# Altium footprint library Connectors THD.PcbLib: 631 footprints (part 22 of 46) (continued)
## HFBR-x41xTZ [mm] "HFBR-14xxZ, HFBR-14xxZ Series With Threaded ST Port, Fiber Optic Transmitter or Receiver, Through Hole Mount" (continued)
3D body: height 10.2, standoff -3.6, extent -5.08,-6.35 22.12,6.35

## HFBR-x52x [mm] "HFBR-0500Z Series, Fiber Optic Transmitter or Receiver, Through Hole Mount"
height 7.62
pads (6):
  round 1.7 hole 1: 1(-3.81,3.81) 2(-3.81,1.27) 3(-3.81,-1.27) 4(-3.81,-3.81) 5(3.81,3.81) 8(3.81,-3.81)
Top Overlay:
  circle w0.2: c11.62,-2.6 r0.6
  circle w0.2: c11.62,2.6 r0.6
  circle w0.3: c-6.65,3.2 r0.15
  lines w0.2: -6.58,-5.08 1.12,-5.08 1.12,-3.05 2.72,-3.05 2.72,-4.25 1.92,-4.065 1.92,-5.08 5.72,-5.08 11.067,-2.833 cw(c11.62,-2.6) 11.311,-2.086 7.554,-3.129 cw(c7.42,-2.647) 6.923,-2.7 6.923,2.7 cw(c7.42,2.647) 7.554,3.129 11.311,2.086 cw(c11.62,2.6) 11.067,2.833 5.72,5.08 1.92,5.08 1.92,6.095 2.72,5.91 2.72,7.11 1.12,7.11 1.12,5.08 -6.58,5.08 -6.58,3.88 -5.98,3.88 -5.98,0.6 -6.58,0.6 -6.58,-0.6 -5.98,-0.6 -5.98,-3.88 -6.58,-3.88 -6.58,-5.08
Mechanical 8:
  lines w0.1: -4.31,-3.81 -3.81,-3.81 ; -4.31,-1.27 -3.81,-1.27 ; -4.31,1.27 -3.81,1.27 ; -4.31,3.81 -3.81,3.81 ; -3.81,-4.31 -3.81,-3.81 ; -3.81,-3.31 -3.81,-3.81 ; -3.81,-1.77 -3.81,-1.27 ; -3.81,-0.77 -3.81,-1.27 ; -3.81,0.77 -3.81,1.27 ; -3.81,1.77 -3.81,1.27 ; -3.81,3.31 -3.81,3.81 ; -3.81,4.31 -3.81,3.81 ; -3.31,-3.81 -3.81,-3.81 ; -3.31,-1.27 -3.81,-1.27 ; -3.31,1.27 -3.81,1.27 ; -3.31,3.81 -3.81,3.81 ; -0.5,0 0,0 ; 0,-0.5 0,0 ; 0,0.5 0,0 ; 0.5,0 0,0 ; 3.31,-3.81 3.81,-3.81 ; 3.31,3.81 3.81,3.81 ; 3.81,-4.31 3.81,-3.81 ; 3.81,-3.31 3.81,-3.81 ; 3.81,3.31 3.81,3.81 ; 3.81,4.31 3.81,3.81 ; 4.31,-3.81 3.81,-3.81 ; 4.31,3.81 3.81,3.81
Mechanical 14:
  circle w0.1: c11.62,2.6 r0.6
  circle w0.1: c11.62,-2.6 r0.6
  circle w0.3: c-6.65,3.2 r0.15
  lines w0.1: -6.58,-5.08 -6.58,-3.88 -5.98,-3.88 -5.98,-0.6 -6.58,-0.6 -6.58,0.6 -5.98,0.6 -5.98,3.88 -6.58,3.88 -6.58,5.08 1.12,5.08 1.12,7.11 2.72,7.11 2.72,5.91 1.92,6.095 1.92,5.08 5.72,5.08 11.067,2.833 ccw(c11.62,2.6) 11.311,2.086 7.554,3.129 ccw(c7.42,2.647) 6.923,2.7 6.923,-2.7 ccw(c7.42,-2.647) 7.554,-3.129 11.311,-2.086 ccw(c11.62,-2.6) 11.067,-2.833 5.72,-5.08 1.92,-5.08 1.92,-4.065 2.72,-4.25 2.72,-3.05 1.12,-3.05 1.12,-5.08 -6.58,-5.08 ; 3.11,-3.81 ccw(c3.81,-3.81) 4.51,-3.81 4.51,3.81 ccw(c3.81,3.81) 3.11,3.81 3.11,-3.81
3D body: height 7.66, standoff -4, extent -6.58,-5.08 12.22,7.11

## HFBR-x53x [mm] "HFBR-0500Z Series, Vertical Package Fiber Optic Transmitter or Receiver, Through Hole Mount"
height 18.8
pads (7):
  round 1.7 hole 1: 1(-3.81,3.81) 2(-3.81,1.27) 3(-3.81,-1.27) 4(-3.81,-3.81) 5(3.81,-3.81) 8(3.81,3.81)
  round 4.6 hole 2.3: MTG1(0,0)
Top Overlay:
  circle w0.2: c-8.24,0 r1.9
  lines w0.2: -11.73,-3.88 -12.75,-3.88 -12.75,-5.08 -11.73,-5.08 ; -11.73,-3.2 -4.901,-3.2 ; -11.73,-2 -4.825,-2 ; -11.73,2 -4.825,2 ; -11.73,3.2 -4.901,3.2 ; -11.73,3.88 -12.75,3.88 -12.75,5.08 5.54,5.08 5.54,-5.08 -11.73,-5.08 ; -4.75,-5.08 -4.75,-4.634 ; -4.75,-0.446 -4.75,0.446 ; -4.75,4.634 -4.75,7.11 -11.73,7.11 -11.73,-5.08 ; -3.276,-2.4 -1.27,-2.4 ; -3.276,2.4 -1.27,2.4 ; 1.484,-2.4 3.49,-2.4 ; 1.484,2.4 3.49,2.4 ; 3.49,-2.602 3.49,2.602 ; 4.13,-2.602 4.13,2.602
Mechanical 8:
  lines w0.1: -4.31,-3.81 -3.81,-3.81 ; -4.31,-1.27 -3.81,-1.27 ; -4.31,1.27 -3.81,1.27 ; -4.31,3.81 -3.81,3.81 ; -3.81,-4.31 -3.81,-3.81 ; -3.81,-3.31 -3.81,-3.81 ; -3.81,-1.77 -3.81,-1.27 ; -3.81,-0.77 -3.81,-1.27 ; -3.81,0.77 -3.81,1.27 ; -3.81,1.77 -3.81,1.27 ; -3.81,3.31 -3.81,3.81 ; -3.81,4.31 -3.81,3.81 ; -3.31,-3.81 -3.81,-3.81 ; -3.31,-1.27 -3.81,-1.27 ; -3.31,1.27 -3.81,1.27 ; -3.31,3.81 -3.81,3.81 ; -0.5,0 0,0 ; 0,-0.5 0,0 ; 0,0.5 0,0 ; 0.5,0 0,0 ; 3.31,-3.81 3.81,-3.81 ; 3.31,3.81 3.81,3.81 ; 3.81,-4.31 3.81,-3.81 ; 3.81,-3.31 3.81,-3.81 ; 3.81,3.31 3.81,3.81 ; 3.81,4.31 3.81,3.81 ; 4.31,-3.81 3.81,-3.81 ; 4.31,3.81 3.81,3.81
Mechanical 14:
  circle w0.1: c-8.24,0 r1.9
  lines w0.1: -11.73,-3.88 -12.75,-3.88 -12.75,-5.08 -11.73,-5.08 ; -11.73,-3.2 -4.11,-3.2 -4.11,-2 -11.73,-2 ; -11.73,2 -4.11,2 -4.11,3.2 -11.73,3.2 ; -11.73,3.88 -12.75,3.88 -12.75,5.08 5.54,5.08 5.54,-5.08 -11.73,-5.08 ; -4.75,-5.08 -4.75,-3.2 ; -4.75,-2 -4.75,2 ; -4.75,-1.6 3.49,-1.6 ; -4.75,1.6 3.49,1.6 ; -4.75,3.2 -4.75,7.11 -11.73,7.11 -11.73,-5.08 ; -4.11,-2.4 3.49,-2.4 ; -4.11,2.4 3.49,2.4 ; 3.11,3.81 cw(c3.81,3.81) 4.51,3.81 ; 3.49,-3.81 ccw(c3.81,-3.81) 4.13,-3.81 4.13,3.81 ccw(c3.81,3.81) 3.49,3.81 3.49,-3.81
3D body: height 18.8, standoff -4, extent -12.75,-5.08 5.54,7.11

## HFBR-x119TZ [mm] "HFBR-2119TZ And HFBR-1119TZ, Fiber Optic Transmitter or Receiver, Through Hole Mount"
height 9.8
pads (16):
  round 1.5 hole 0.8: 1(-8.89,-3.81) 2(-6.35,-3.81) 3(-3.81,-3.81) 4(-1.27,-3.81) 5(1.27,-3.81) 6(3.81,-3.81) 7(6.35,-3.81) 8(8.89,-3.81) 9(8.89,3.81) 10(6.35,3.81) 11(3.81,3.81) 12(1.27,3.81) 13(-1.27,3.81) 14(-3.81,3.81) 15(-6.35,3.81) 16(-8.89,3.81)
Top Overlay:
  lines w0.2: 11.34,-3.8 11.74,3.8 ; 11.34,3.5 11.74,3.8 ; 11.356,-3.5 11.74,-3.8 ; 23.49,-3.5 23.49,-4.1 24.79,-4.1 24.79,-3.5 ; 23.49,3.5 23.49,4.1 24.79,4.1 24.79,3.5 ; 28.64,-0.6 22.74,-0.6 cw(c22.74,0) 22.74,0.6 28.64,0.6 ; 11.74,-3.8 12.156,-3.5 ; 11.74,-3.8 12.124,3.5 ; 11.74,3.8 12.124,3.5 ; 12.124,3.5 12.54,3.8 ; 12.156,-3.5 12.54,-3.8 ; 12.156,-3.5 12.54,3.8 ; 12.54,-3.8 12.956,-3.5 ; 12.54,-3.8 12.924,3.5 ; 12.54,3.8 12.924,3.5 ; 12.924,3.5 13.34,3.8 ; 12.956,-3.5 13.34,-3.8 ; 12.956,-3.5 13.34,3.8 ; 13.34,-3.8 13.756,-3.5 ; 13.34,-3.8 13.724,3.5 ; 13.34,3.8 13.724,3.5 ; 13.724,3.5 14.14,3.8 ; 13.756,-3.5 14.14,-3.8 ; 13.756,-3.5 14.14,3.8 ; 14.14,-3.8 14.556,-3.5 ; 14.14,-3.8 14.524,3.5 ; 14.14,3.8 14.524,3.5 ; 14.524,3.5 14.94,3.8 ; 14.556,-3.5 14.94,-3.8 ; 14.556,-3.5 14.94,3.8 ; 14.94,-3.8 15.356,-3.5 ; 14.94,-3.8 15.324,3.5 ; 14.94,3.8 15.324,3.5 ; 15.324,3.5 15.74,3.8 ; 15.356,-3.5 15.74,-3.8 16.14,-3.5 ; 15.356,-3.5 15.74,3.8 ; 15.74,3.8 16.14,3.5 ; 16.14,-3.5 16.14,3.5 ; 16.14,-3.5 28.64,-3.5 28.64,3.5 16.14,3.5 ; -12.06,-6.095 -12.06,6.095 11.34,6.095 11.34,-6.095 -12.06,-6.095
Mechanical 8:
  lines w0.1: -9.39,-3.81 -8.89,-3.81 ; -9.39,3.81 -8.89,3.81 ; -8.89,-4.31 -8.89,-3.81 ; -8.89,-3.31 -8.89,-3.81 ; -8.89,3.31 -8.89,3.81 ; -8.89,4.31 -8.89,3.81 ; -8.39,-3.81 -8.89,-3.81 ; -8.39,3.81 -8.89,3.81 ; -6.85,-3.81 -6.35,-3.81 ; -6.85,3.81 -6.35,3.81 ; -6.35,-4.31 -6.35,-3.81 ; -6.35,-3.31 -6.35,-3.81 ; -6.35,3.31 -6.35,3.81 ; -6.35,4.31 -6.35,3.81 ; -5.85,-3.81 -6.35,-3.81 ; -5.85,3.81 -6.35,3.81 ; -4.31,-3.81 -3.81,-3.81 ; -4.31,3.81 -3.81,3.81 ; -3.81,-4.31 -3.81,-3.81 ; -3.81,-3.31 -3.81,-3.81 ; -3.81,3.31 -3.81,3.81 ; -3.81,4.31 -3.81,3.81 ; -3.31,-3.81 -3.81,-3.81 ; -3.31,3.81 -3.81,3.81 ; -1.77,-3.81 -1.27,-3.81 ; -1.77,3.81 -1.27,3.81 ; -1.27,-4.31 -1.27,-3.81 ; -1.27,-3.31 -1.27,-3.81 ; -1.27,3.31 -1.27,3.81 ; -1.27,4.31 -1.27,3.81 ; -0.77,-3.81 -1.27,-3.81 ; -0.77,3.81 -1.27,3.81 ; -0.5,0 0,0 ; 0,-0.5 0,0 ; 0,0.5 0,0 ; 0.5,0 0,0 ; 0.77,-3.81 1.27,-3.81 ; 0.77,3.81 1.27,3.81 ; 1.27,-4.31 1.27,-3.81 ; 1.27,-3.31 1.27,-3.81 ; 1.27,3.31 1.27,3.81 ; 1.27,4.31 1.27,3.81 ; 1.77,-3.81 1.27,-3.81 ; 1.77,3.81 1.27,3.81 ; 3.31,-3.81 3.81,-3.81 ; 3.31,3.81 3.81,3.81 ; 3.81,-4.31 3.81,-3.81 ; 3.81,-3.31 3.81,-3.81 ; 3.81,3.31 3.81,3.81 ; 3.81,4.31 3.81,3.81 ; 4.31,-3.81 3.81,-3.81 ; 4.31,3.81 3.81,3.81 ; 5.85,-3.81 6.35,-3.81 ; 5.85,3.81 6.35,3.81 ; 6.35,-4.31 6.35,-3.81 ; 6.35,-3.31 6.35,-3.81 ; 6.35,3.31 6.35,3.81 ; 6.35,4.31 6.35,3.81 ; 6.85,-3.81 6.35,-3.81 ; 6.85,3.81 6.35,3.81 ; 8.39,-3.81 8.89,-3.81 ; 8.39,3.81 8.89,3.81 ; 8.89,-4.31 8.89,-3.81 ; 8.89,-3.31 8.89,-3.81 ; 8.89,3.31 8.89,3.81 ; 8.89,4.31 8.89,3.81 ; 9.39,-3.81 8.89,-3.81 ; 9.39,3.81 8.89,3.81
Mechanical 14:
  lines w0.1: 11.34,-3.8 11.74,3.8 ; 11.34,3.5 11.74,3.8 ; 11.356,-3.5 11.74,-3.8 ; 23.49,-3.5 23.49,-4.1 24.79,-4.1 24.79,-3.5 ; 23.49,3.5 23.49,4.1 24.79,4.1 24.79,3.5 ; 28.64,-0.6 22.74,-0.6 cw(c22.74,0) 22.74,0.6 28.64,0.6 ; 11.74,-3.8 12.156,-3.5 ; 11.74,-3.8 12.124,3.5 ; 11.74,3.8 12.124,3.5 ; 12.124,3.5 12.54,3.8 ; 12.156,-3.5 12.54,-3.8 ; 12.156,-3.5 12.54,3.8 ; 12.54,-3.8 12.956,-3.5 ; 12.54,-3.8 12.924,3.5 ; 12.54,3.8 12.924,3.5 ; 12.924,3.5 13.34,3.8 ; 12.956,-3.5 13.34,-3.8 ; 12.956,-3.5 13.34,3.8 ; 13.34,-3.8 13.756,-3.5 ; 13.34,-3.8 13.724,3.5 ; 13.34,3.8 13.724,3.5 ; 13.724,3.5 14.14,3.8 ; 13.756,-3.5 14.14,-3.8 ; 13.756,-3.5 14.14,3.8 ; 14.14,-3.8 14.556,-3.5 ; 14.14,-3.8 14.524,3.5 ; 14.14,3.8 14.524,3.5 ; 14.524,3.5 14.94,3.8 ; 14.556,-3.5 14.94,-3.8 ; 14.556,-3.5 14.94,3.8 ; 14.94,-3.8 15.356,-3.5 ; 14.94,-3.8 15.324,3.5 ; 14.94,3.8 15.324,3.5 ; 15.324,3.5 15.74,3.8 ; 15.356,-3.5 15.74,-3.8 16.14,-3.5 ; 15.356,-3.5 15.74,3.8 ; 15.74,3.8 16.14,3.5 ; 16.14,-3.5 16.14,3.5 ; 16.14,-3.5 28.64,-3.5 28.64,3.5 16.14,3.5 ; -12.06,-6.095 -12.06,6.095 11.34,6.095 11.34,-6.095 -12.06,-6.095
3D body: height 9.8, standoff -3.2, extent -12.06,-6.095 28.64,6.095

## HIROSE_FX2-40P-1.27DSL(71) [mm] "40 Contacts, 1.27mm Pitch, Right Angle Board to Board & Mezzanine Header with Prefixed Pin"
height 7.5
pads (42):
  round 1.5 hole 0.8: a1(-12.065,-0.953) a2(-10.795,-2.858) a3(-9.525,-0.953) a4(-8.255,-2.858) a5(-6.985,-0.953) a6(-5.715,-2.858) a7(-4.445,-0.953) a8(-3.175,-2.858) a9(-1.905,-0.953) a10(-0.635,-2.858) a11(0.635,-0.953) a12(1.905,-2.858) a13(3.175,-0.953) a14(4.445,-2.858) a15(5.715,-0.953) a16(6.985,-2.858) a17(8.255,-0.953) a18(9.525,-2.858) a19(10.795,-0.953) a20(12.065,-2.858) b1(-12.065,2.858) b2(-10.795,0.953) b3(-9.525,2.858) b4(-8.255,0.953) b5(-6.985,2.858) b6(-5.715,0.953) b7(-4.445,2.858) b8(-3.175,0.953) b9(-1.905,2.858) b10(-0.635,0.953) b11(0.635,2.858) b12(1.905,0.953) b13(3.175,2.858) b14(4.445,0.953) b15(5.715,2.858) b16(6.985,0.953) b17(8.255,2.858) b18(9.525,0.953) b19(10.795,2.858) b20(12.065,0.953)
  round 3 hole 2.3: MECH1(-15.375,0.953) MECH2(15.375,0.953)
Top Overlay:
  circle w0.3: c-12.1,-4.3 r0.15
  lines w0.2: -17.725,-0.243 -17.375,-0.243 -15.375,-1.398 -13.375,-0.243 -13.025,-0.243 ; -17.725,2.148 -17.375,2.148 -15.375,3.303 -13.375,2.148 -13.025,2.148 ; -13.025,-3.643 -13.025,-1.586 ; -13.025,-0.319 -13.025,2.224 ; -11.635,-3.643 -17.725,-3.643 -17.725,11.358 17.725,11.358 17.725,-3.643 12.905,-3.643 ; 11.944,3.858 13.025,3.858 13.025,1.586 ; 13.025,-3.643 13.025,-3.491 ; 13.025,-2.224 13.025,0.319 ; 13.025,-0.243 13.375,-0.243 15.375,-1.398 17.375,-0.243 17.725,-0.243 ; 13.025,2.148 13.375,2.148 15.375,3.303 17.375,2.148 17.725,2.148 ; -17.725,3.558 -12.977,3.558 -17.725,3.558 ; 13.025,3.558 17.725,3.558 13.025,3.558
  text "a1" at -14.787,-2.66 h1
  text "a20" at 13.588,-3.085 h1
  text "b1" at -12.647,4.742 h1
  text "b19" at 10.213,4.742 h1
Mechanical 8:
  drawing of 172 lines, arcs and shapes, not listed
Mechanical 14:
  circle w0.3: c-13.6,-1.1 r0.15
  lines w0.1: -17.725,-0.243 -17.375,-0.243 -15.375,-1.398 -13.375,-0.243 -13.025,-0.243 ; -17.725,2.148 -17.375,2.148 -15.375,3.303 -13.375,2.148 -13.025,2.148 ; -13.025,-3.643 -13.025,3.858 13.025,3.858 13.025,-3.643 ; -12.34,3.858 -12.34,-1.102 -11.79,-1.102 -11.79,3.858 ; -11.07,3.858 -11.07,-3.008 -10.52,-3.008 -10.52,3.858 ; -9.8,3.858 -9.8,-1.102 -9.25,-1.102 -9.25,3.858 ; -8.53,3.858 -8.53,-3.008 -7.98,-3.008 -7.98,3.858 ; -7.26,3.858 -7.26,-1.102 -6.71,-1.102 -6.71,3.858 ; -5.99,3.858 -5.99,-3.008 -5.44,-3.008 -5.44,3.858 ; -4.72,3.858 -4.72,-1.102 -4.17,-1.102 -4.17,3.858 ; -3.45,3.858 -3.45,-3.008 -2.9,-3.008 -2.9,3.858 ; -2.18,3.858 -2.18,-1.102 -1.63,-1.102 -1.63,3.858 ; -0.91,3.858 -0.91,-3.008 -0.36,-3.008 -0.36,3.858 ; 0.36,3.858 0.36,-1.102 0.91,-1.102 0.91,3.858 ; 1.63,3.858 1.63,-3.008 2.18,-3.008 2.18,3.858 ; 2.9,3.858 2.9,-1.102 3.45,-1.102 3.45,3.858 ; 4.17,3.858 4.17,-3.008 4.72,-3.008 4.72,3.858 ; 5.44,3.858 5.44,-1.102 5.99,-1.102 5.99,3.858 ; 6.71,3.858 6.71,-3.008 7.26,-3.008 7.26,3.858 ; 7.98,3.858 7.98,-1.102 8.53,-1.102 8.53,3.858 ; 9.25,3.858 9.25,-3.008 9.8,-3.008 9.8,3.858 ; 10.52,3.858 10.52,-1.102 11.07,-1.102 11.07,3.858 ; 11.79,3.858 11.79,-3.008 12.34,-3.008 12.34,3.858 ; 13.025,-0.243 13.375,-0.243 15.375,-1.398 17.375,-0.243 17.725,-0.243 ; 13.025,2.148 13.375,2.148 15.375,3.303 17.375,2.148 17.725,2.148 ; -17.725,-3.643 17.725,-3.643 17.725,11.358 -17.725,11.358 -17.725,-3.643 ; -17.725,3.558 -13.025,3.558 -17.725,3.558 ; -15.625,-1.048 -15.625,2.953 -15.125,2.953 -15.125,-1.048 -15.625,-1.048 ; 13.025,3.558 17.725,3.558 13.025,3.558 ; 15.125,-1.048 15.125,2.953 15.625,2.953 15.625,-1.048 15.125,-1.048
  text "a1" at -14.787,-2.66 h1
  text "a20" at 13.588,-3.085 h1
  text "b1" at -12.647,4.742 h1
  text "b19" at 10.213,4.742 h1
3D body: height 7.5, standoff -3.3, extent -17.725,-3.642 17.725,11.358

## HIROSE_FX2-80P-1.27DSL(71) [mm] "80 Contacts, 1.27mm Pitch, Right Angle Board to Board & Mezzanine Header with Prefixed Pin"
height 7.5
pads (82):
  round 1.5 hole 0.8: a1(-24.765,-0.953) a2(-23.495,-2.858) a3(-22.225,-0.953) a4(-20.955,-2.858) a5(-19.685,-0.953) a6(-18.415,-2.858) a7(-17.145,-0.953) a8(-15.875,-2.858) a9(-14.605,-0.953) a10(-13.335,-2.858) a11(-12.065,-0.953) a12(-10.795,-2.858) a13(-9.525,-0.953) a14(-8.255,-2.858) a15(-6.985,-0.953) a16(-5.715,-2.858) a17(-4.445,-0.953) a18(-3.175,-2.858) a19(-1.905,-0.953) a20(-0.635,-2.858) a21(0.635,-0.953) a22(1.905,-2.858) a23(3.175,-0.953) a24(4.445,-2.858) a25(5.715,-0.953) a26(6.985,-2.858) a27(8.255,-0.953) a28(9.525,-2.858) a29(10.795,-0.953) a30(12.065,-2.858) a31(13.335,-0.953) a32(14.605,-2.858) a33(15.875,-0.953) a34(17.145,-2.858) a35(18.415,-0.953) a36(19.685,-2.858) a37(20.955,-0.953) a38(22.225,-2.858) a39(23.495,-0.953) a40(24.765,-2.858) b1(-24.765,2.858) b2(-23.495,0.953) b3(-22.225,2.858) b4(-20.955,0.953) b5(-19.685,2.858) b6(-18.415,0.953) b7(-17.145,2.858) b8(-15.875,0.953) b9(-14.605,2.858) b10(-13.335,0.953) b11(-12.065,2.858) b12(-10.795,0.953) b13(-9.525,2.858) b14(-8.255,0.953) b15(-6.985,2.858) b16(-5.715,0.953) b17(-4.445,2.858) b18(-3.175,0.953) b19(-1.905,2.858) b20(-0.635,0.953) b21(0.635,2.858) b22(1.905,0.953) b23(3.175,2.858) b24(4.445,0.953) b25(5.715,2.858) b26(6.985,0.953) b27(8.255,2.858) b28(9.525,0.953) b29(10.795,2.858) b30(12.065,0.953) b31(13.335,2.858) b32(14.605,0.953) b33(15.875,2.858) b34(17.145,0.953) b35(18.415,2.858) b36(19.685,0.953) b37(20.955,2.858) b38(22.225,0.953) b39(23.495,2.858) b40(24.765,0.953)
  round 3 hole 2.3: MECH1(-28.075,0.953) MECH2(28.075,0.953)
Top Overlay:
  circle w0.3: c-24.8,-4.3 r0.15
  lines w0.2: -30.425,-0.243 -30.075,-0.243 -28.075,-1.398 -26.075,-0.243 -25.725,-0.243 ; -30.425,2.148 -30.075,2.148 -28.075,3.303 -26.075,2.148 -25.725,2.148 ; -25.725,-3.643 -25.725,-1.586 ; -25.725,-0.319 -25.725,2.224 ; -24.335,-3.643 -30.425,-3.643 -30.425,11.358 30.425,11.358 30.425,-3.643 25.605,-3.643 ; 24.644,3.858 25.725,3.858 25.725,1.586 ; 25.725,-3.643 25.725,-3.491 ; 25.725,-2.224 25.725,0.319 ; 25.725,-0.243 26.075,-0.243 28.075,-1.398 30.075,-0.243 30.425,-0.243 ; 25.725,2.148 26.075,2.148 28.075,3.303 30.075,2.148 30.425,2.148 ; -30.425,3.558 -25.725,3.558 -30.425,3.558 ; 25.725,3.558 30.425,3.558 25.725,3.558
  text "b1" at -25.347,4.742 h1
  text "b39" at 22.913,4.742 h1
  text "a1" at -27.487,-2.66 h1
  text "a40" at 26.288,-3.085 h1
Mechanical 8:
  drawing of 332 lines, arcs and shapes, not listed
Mechanical 14:
  drawing of 156 lines, arcs and shapes, not listed
  text "b1" at -25.347,4.742 h1
  text "b39" at 22.913,4.742 h1
  text "a1" at -27.487,-2.66 h1
  text "a40" at 26.288,-3.085 h1
3D body: height 7.5, standoff -3.3, extent -30.425,-3.642 30.425,11.358

## HIROSE_FX2B-80PA-1.27DSL(71) [mm] "80 Contacts, 1.27mm Pitch, Right Angle Board to Board & Mezzanine Header with Prefixed Pin"
height 7.5
pads (82):
  round 1.5 hole 0.8: a1(-24.765,-0.953) a2(-23.495,-2.858) a3(-22.225,-0.953) a4(-20.955,-2.858) a5(-19.685,-0.953) a6(-18.415,-2.858) a7(-17.145,-0.953) a8(-15.875,-2.858) a9(-14.605,-0.953) a10(-13.335,-2.858) a11(-12.065,-0.953) a12(-10.795,-2.858) a13(-9.525,-0.953) a14(-8.255,-2.858) a15(-6.985,-0.953) a16(-5.715,-2.858) a17(-4.445,-0.953) a18(-3.175,-2.858) a19(-1.905,-0.953) a20(-0.635,-2.858) a21(0.635,-0.953) a22(1.905,-2.858) a23(3.175,-0.953) a24(4.445,-2.858) a25(5.715,-0.953) a26(6.985,-2.858) a27(8.255,-0.953) a28(9.525,-2.858) a29(10.795,-0.953) a30(12.065,-2.858) a31(13.335,-0.953) a32(14.605,-2.858) a33(15.875,-0.953) a34(17.145,-2.858) a35(18.415,-0.953) a36(19.685,-2.858) a37(20.955,-0.953) a38(22.225,-2.858) a39(23.495,-0.953) a40(24.765,-2.858) b1(-24.765,2.858) b2(-23.495,0.953) b3(-22.225,2.858) b4(-20.955,0.953) b5(-19.685,2.858) b6(-18.415,0.953) b7(-17.145,2.858) b8(-15.875,0.953) b9(-14.605,2.858) b10(-13.335,0.953) b11(-12.065,2.858) b12(-10.795,0.953) b13(-9.525,2.858) b14(-8.255,0.953) b15(-6.985,2.858) b16(-5.715,0.953) b17(-4.445,2.858) b18(-3.175,0.953) b19(-1.905,2.858) b20(-0.635,0.953) b21(0.635,2.858) b22(1.905,0.953) b23(3.175,2.858) b24(4.445,0.953) b25(5.715,2.858) b26(6.985,0.953) b27(8.255,2.858) b28(9.525,0.953) b29(10.795,2.858) b30(12.065,0.953) b31(13.335,2.858) b32(14.605,0.953) b33(15.875,2.858) b34(17.145,0.953) b35(18.415,2.858) b36(19.685,0.953) b37(20.955,2.858) b38(22.225,0.953) b39(23.495,2.858) b40(24.765,0.953)
  round 3 hole 2.3: MECH1(-28.075,0.953) MECH2(28.075,0.953)
Top Overlay:
  circle w0.3: c-24.8,-4.3 r0.15
  lines w0.2: -30.425,-0.243 -30.075,-0.243 -28.075,-1.398 -26.075,-0.243 -25.725,-0.243 -25.725,2.148 -26.075,2.148 -28.075,3.303 -30.075,2.148 -30.425,2.148 ; -30.425,3.858 -30.425,-3.643 -24.335,-3.643 ; -25.333,3.858 -34.215,3.858 -34.215,9.708 -30.375,9.708 -28.675,11.358 28.675,11.358 30.375,9.708 34.215,9.708 34.215,3.858 24.063,3.858 ; 25.605,-3.643 30.425,-3.643 30.425,3.858 ; 30.425,-0.243 30.075,-0.243 28.075,-1.398 26.075,-0.243 25.725,-0.243 25.725,2.148 26.075,2.148 28.075,3.303 30.075,2.148 30.425,2.148
  text "b39" at 22.913,4.742 h1
  text "b1" at -25.347,4.742 h1
  text "a40" at 26.288,-3.085 h1
  text "a1" at -27.487,-2.66 h1
Mechanical 8:
  drawing of 332 lines, arcs and shapes, not listed
Mechanical 14:
  circle w0.3: c-26.3,-1.1 r0.15
  lines w0.1: -30.425,-0.243 -30.075,-0.243 -28.075,-1.398 -26.075,-0.243 -25.725,-0.243 -25.725,2.148 -26.075,2.148 -28.075,3.303 -30.075,2.148 -30.425,2.148 ; -30.425,3.858 -30.425,-3.643 30.425,-3.643 30.425,3.858 ; 30.425,-0.243 30.075,-0.243 28.075,-1.398 26.075,-0.243 25.725,-0.243 25.725,2.148 26.075,2.148 28.075,3.303 30.075,2.148 30.425,2.148 ; -34.215,3.858 -34.215,9.708 -30.375,9.708 -28.675,11.358 28.675,11.358 30.375,9.708 34.215,9.708 34.215,3.858 -34.215,3.858 ; -28.325,-1.048 -28.325,2.953 -27.825,2.953 -27.825,-1.048 -28.325,-1.048 ; 27.825,-1.048 27.825,2.953 28.325,2.953 28.325,-1.048 27.825,-1.048
  text "b39" at 22.913,4.742 h1
  text "b1" at -25.347,4.742 h1
  text "a40" at 26.288,-3.085 h1
  text "a1" at -27.487,-2.66 h1
3D body: height 7.5, standoff -3.3, extent -34.215,-3.642 34.215,11.358

## HONDA_PCS-E68LMD+ [mm] "1.27mm Pitch Connector, 68 Male Contacts, Right-Angle, PCS Series"
height 9.77
pads (70):
  round 1.5 hole 0.8: 1(20.955,-3.81) 2(19.685,-1.905) 3(18.415,-3.81) 4(17.145,-1.905) 5(15.875,-3.81) 6(14.605,-1.905) 7(13.335,-3.81) 8(12.065,-1.905) 9(10.795,-3.81) 10(9.525,-1.905) 11(8.255,-3.81) 12(6.985,-1.905) 13(5.715,-3.81) 14(4.445,-1.905) 15(3.175,-3.81) 16(1.905,-1.905) 17(0.635,-3.81) 18(-0.635,-1.905) 19(-1.905,-3.81) 20(-3.175,-1.905) 21(-4.445,-3.81) 22(-5.715,-1.905) 23(-6.985,-3.81) 24(-8.255,-1.905) 25(-9.525,-3.81) 26(-10.795,-1.905) 27(-12.065,-3.81) 28(-13.335,-1.905) 29(-14.605,-3.81) 30(-15.875,-1.905) 31(-17.145,-3.81) 32(-18.415,-1.905) 33(-19.685,-3.81) 34(-20.955,-1.905) 35(20.955,0) 36(19.685,1.905) 37(18.415,0) 38(17.145,1.905) 39(15.875,0) 40(14.605,1.905) 41(13.335,0) 42(12.065,1.905) 43(10.795,0) 44(9.525,1.905) 45(8.255,0) 46(6.985,1.905) 47(5.715,0) 48(4.445,1.905) 49(3.175,0) 50(1.905,1.905) 51(0.635,0) 52(-0.635,1.905) 53(-1.905,0) 54(-3.175,1.905) 55(-4.445,0) 56(-5.715,1.905) 57(-6.985,0) 58(-8.255,1.905) 59(-9.525,0) 60(-10.795,1.905) 61(-12.065,0) 62(-13.335,1.905) 63(-14.605,0) 64(-15.875,1.905) 65(-17.145,0) 66(-18.415,1.905) 67(-19.685,0) 68(-20.955,1.905)
  round 4.5 hole 2.8: 69(-28.95,0) 70(28.95,0)
Top Overlay:
  lines w0.2: -32.15,3.905 -25.355,3.905 ; -32.15,5.905 32.15,5.905 ; -26.555,-4.795 -26.555,-1.778 ; -26.555,1.778 -26.555,3.905 ; -26.555,3.105 26.555,3.105 ; -26.05,6.705 -26.05,10.705 -26.9,10.705 -26.9,11.355 -26.05,12.205 26.05,12.205 26.9,11.355 26.9,10.705 26.05,10.705 26.05,6.705 ; -25.355,-4.795 -25.355,3.105 ; -23.855,-4.795 -23.855,-3.048 ; -23.855,-1.143 -23.855,1.143 ; -23.855,-0.953 -21.907,-0.953 ; -23.855,2.667 -23.855,3.105 ; -23.455,-4.795 -23.455,-3.048 ; -21,3.105 -21,3.905 21,3.905 21,3.105 ; -20.637,-4.795 -31.65,-4.795 cw(c-31.65,-4.295) -32.15,-4.295 -32.15,6.705 32.15,6.705 32.15,-4.295 cw(c31.65,-4.295) 31.65,-4.795 21.936,-4.795 ; -19.685,-2.54 -19.685,-1.27 ; -19.685,1.27 -19.685,3.105 ; -18.415,-0.635 -18.415,0.635 ; -17.145,-2.54 -17.145,-1.27 ; -17.145,1.27 -17.145,3.105 ; -15.875,-0.635 -15.875,0.635 ; -14.605,-2.54 -14.605,-1.27 ; -14.605,1.27 -14.605,3.105 ; -13.335,-0.635 -13.335,0.635 ; -12.065,-2.54 -12.065,-1.27 ; -12.065,1.27 -12.065,3.105 ; -10.795,-0.635 -10.795,0.635 ; -9.525,-2.54 -9.525,-1.27 ; -9.525,1.27 -9.525,3.105 ; -8.255,-0.635 -8.255,0.635 ; -6.985,-2.54 -6.985,-1.27 ; -6.985,1.27 -6.985,3.105 ; -5.715,-0.635 -5.715,0.635 ; -4.445,-2.54 -4.445,-1.27 ; -4.445,1.27 -4.445,3.105 ; -3.175,-0.635 -3.175,0.635 ; -1.905,-2.54 -1.905,-1.27 ; -1.905,1.27 -1.905,3.105 ; -0.635,-0.635 -0.635,0.635 ; 0.635,-2.54 0.635,-1.27 ; 0.635,1.27 0.635,3.105 ; 1.905,-0.635 1.905,0.635 ; 3.175,-2.54 3.175,-1.27 ; 3.175,1.27 3.175,3.105 ; 4.445,-0.635 4.445,0.635 ; 5.715,-2.54 5.715,-1.27 ; 5.715,1.27 5.715,3.105 ; 6.985,-0.635 6.985,0.635 ; 8.255,-2.54 8.255,-1.27 ; 8.255,1.27 8.255,3.105 ; 9.525,-0.635 9.525,0.635 ; 10.795,-2.54 10.795,-1.27 ; 10.795,1.27 10.795,3.105 ; 12.065,-0.635 12.065,0.635 ; 13.335,-2.54 13.335,-1.27 ; 13.335,1.27 13.335,3.105 ; 14.605,-0.635 14.605,0.635 ; 15.875,-2.54 15.875,-1.27 ; 15.875,1.27 15.875,3.105 ; 17.145,-0.635 17.145,0.635 ; 18.415,-2.54 18.415,-1.27 ; 18.415,1.27 18.415,3.105 ; 19.685,-0.635 19.685,0.635 ; 21.945,-0.953 23.855,-0.953 23.855,-4.795 ; 23.455,-4.795 23.455,-0.953 ; 23.855,1.016 23.855,3.105 ; 25.355,-4.795 25.355,3.105 ; 25.355,3.905 32.15,3.905 ; 26.555,-4.795 26.555,-1.778 ; 26.555,1.778 26.555,3.905
  text "33" at -22.345,-4.31 h1
  text "1" at 22.213,-4.31 h1
  text "2" at 20.929,-2.405 h1
  text "36" at 20.976,1.405 h1
  text "67" at -22.245,-0.5 h1
  text "34" at -23.638,-2.532 h1
  text "68" at -23.615,1.405 h1
  text "35" at 22.095,-0.5 h1
Mechanical 8:
  lines w0.1: -32.15,5.705 -31.15,5.705 ; -30.15,5.705 -29.15,5.705 ; -28.15,5.705 -27.15,5.705 ; -26.15,5.705 -25.15,5.705 ; -24.15,5.705 -23.15,5.705 ; -22.15,5.705 -21.15,5.705 ; -20.15,5.705 -19.15,5.705 ; -18.15,5.705 -17.15,5.705 ; -16.15,5.705 -15.15,5.705 ; -14.15,5.705 -13.15,5.705 ; -12.15,5.705 -11.15,5.705 ; -10.15,5.705 -9.15,5.705 ; -8.15,5.705 -7.15,5.705 ; -6.15,5.705 -5.15,5.705 ; 5.15,5.705 6.15,5.705 ; 7.15,5.705 8.15,5.705 ; 9.15,5.705 10.15,5.705 ; 11.15,5.705 12.15,5.705 ; 13.15,5.705 14.15,5.705 ; 15.15,5.705 16.15,5.705 ; 17.15,5.705 18.15,5.705 ; 19.15,5.705 20.15,5.705 ; 21.15,5.705 22.15,5.705 ; 23.15,5.705 24.15,5.705 ; 25.15,5.705 26.15,5.705 ; 27.15,5.705 28.15,5.705 ; 29.15,5.705 30.15,5.705 ; 31.15,5.705 32.15,5.705
  text "PCB EDGE" at -3.714,4.705 h1
Mechanical 14:
  drawing of 189 lines, arcs and shapes, not listed
  text "33" at -22.345,-4.31 h1
  text "1" at 22.213,-4.31 h1
  text "2" at 20.929,-2.405 h1
  text "36" at 20.976,1.405 h1
  text "67" at -22.245,-0.5 h1
  text "34" at -23.638,-2.532 h1
  text "68" at -23.615,1.405 h1
  text "35" at 22.095,-0.5 h1
3D body: height 9.77, standoff -3.4, extent -32.15,-4.795 32.15,12.205

## HUBER-SUHNER_82 SMA-50-0-41/133 NE [mm] "50 Ohm SMA Straight PCB Jack"
height 9.5
pads (5):
  round 2.2 hole 1.5: 1(0,0)
  round 2.3 hole 1.6: 2(-2.54,-2.54) 2(-2.54,2.54) 2(2.54,-2.54) 2(2.54,2.54)
Top Overlay:
  lines w0.2: -3.2,-1.138 -3.2,1.138 ; -2.921,-1.038 cw(c0,0) -2.921,1.038 ; -2.457,-0.992 cw(c0,0) -2.457,0.992 ; -1.138,-3.2 1.138,-3.2 ; -1.138,3.2 1.138,3.2 ; -1.038,-2.921 ccw(c0,0) 1.038,-2.921 ; -1.038,2.921 cw(c0,0) 1.038,2.921 ; -0.992,-2.457 ccw(c0,0) 0.992,-2.457 ; -0.992,2.457 cw(c0,0) 0.992,2.457 ; 2.457,-0.992 ccw(c0,0) 2.457,0.992 ; 2.921,-1.038 ccw(c0,0) 2.921,1.038 ; 3.2,-1.138 3.2,1.138
Mechanical 8:
  lines w0.1: -3.54,-2.54 -2.54,-2.54 ; -3.54,2.54 -2.54,2.54 ; -2.54,-3.54 -2.54,-2.54 ; -2.54,-1.54 -2.54,-2.54 ; -2.54,1.54 -2.54,2.54 ; -2.54,3.54 -2.54,2.54 ; -1.54,-2.54 -2.54,-2.54 ; -1.54,2.54 -2.54,2.54 ; -1,0 0,0 ; 0,-1 0,0 ; 0,1 0,0 ; 1,0 0,0 ; 1.54,-2.54 2.54,-2.54 ; 1.54,2.54 2.54,2.54 ; 2.54,-3.54 2.54,-2.54 ; 2.54,-1.54 2.54,-2.54 ; 2.54,1.54 2.54,2.54 ; 2.54,3.54 2.54,2.54 ; 3.54,-2.54 2.54,-2.54 ; 3.54,2.54 2.54,2.54
Mechanical 14:
  circle w0.1: c0,0 r3.1
  circle w0.1: c0,0 r2.65
  circle w0.1: c0,0 r0.5
  lines w0.1: -3.2,-3.2 3.2,-3.2 3.2,3.2 -3.2,3.2 -3.2,-3.2
3D body: height 9.5, standoff -4, extent -3.2,-3.2 3.2,3.2